# Altium schematic symbol library jlcpcb_2025_04_resistors_extended_0201.schlib: 1508 symbols (part 3 of 8)
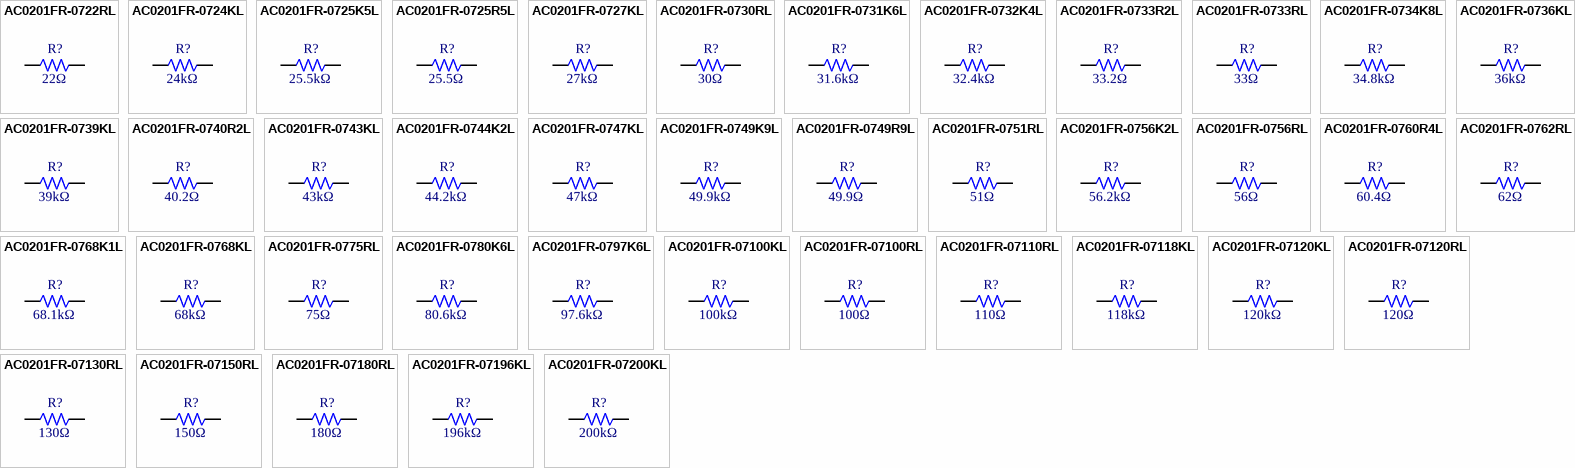
[diagram p39: symbols AC0201FR-0722RL to AC0201FR-07200KL]

## AC0201FR-07100KL
designator R?  Resistance: 100kΩ  (hidden comment: *)
Resistor, 100kΩ, ±1%, 50mW, 25V, ±200ppm/℃, -55℃~+155℃, SMD 0201; Manufacturer: Uniroyal; Manufacturer Part Number: AC0201FR-07100KL; Supplier 1: LCSC; Supplier Part Number 1: C226394; JLCPCB Part Number: C226394; Power Rating: 50mW; Category: Resistors; Package Size: 0201; JLCPCB Basic Part: Yes; Tolerance: ±1%; Voltage Rating: 25V; Temperature Coefficient: ±200ppm/℃; Temperature Rating: -55℃~+155℃; ComponentLink1Description: Datasheet; ComponentLink1URL: https://wmsc.lcsc.com/wmsc/upload/file/pdf/v2/lcsc/2008251104_YAGEO-AC0201FR-07100KL_C226394.pdf; ComponentLink2Description: JLCPCB Part URL; ComponentLink2URL: https://jlcpcb.com/partdetail/C226394
pins: 1, 2
1 alternate drawing of the same symbol

## AC0201FR-07100RL
designator R?  Resistance: 100Ω  (hidden comment: *)
Resistor, 100Ω, ±1%, 50mW, 25V, ±200ppm/℃, -55℃~+155℃, SMD 0201; Manufacturer: Uniroyal; Manufacturer Part Number: AC0201FR-07100RL; Supplier 1: LCSC; Supplier Part Number 1: C226395; JLCPCB Part Number: C226395; Power Rating: 50mW; Category: Resistors; Package Size: 0201; JLCPCB Basic Part: Yes; Tolerance: ±1%; Voltage Rating: 25V; Temperature Coefficient: ±200ppm/℃; Temperature Rating: -55℃~+155℃; ComponentLink1Description: Datasheet; ComponentLink1URL: https://wmsc.lcsc.com/wmsc/upload/file/pdf/v2/lcsc/2201242230_YAGEO-AC0201FR-07100RL_C226395.pdf; ComponentLink2Description: JLCPCB Part URL; ComponentLink2URL: https://jlcpcb.com/partdetail/C226395
pins: 1, 2
1 alternate drawing of the same symbol

## AC0201FR-07110RL
designator R?  Resistance: 110Ω  (hidden comment: *)
Resistor, 110Ω, ±1%, 50mW, ±200ppm/℃, -55℃~+155℃, SMD 0201; Manufacturer: Uniroyal; Manufacturer Part Number: AC0201FR-07110RL; Supplier 1: LCSC; Supplier Part Number 1: C910593; JLCPCB Part Number: C910593; Power Rating: 50mW; Category: Resistors; Package Size: 0201; JLCPCB Basic Part: Yes; Tolerance: ±1%; Temperature Coefficient: ±200ppm/℃; Temperature Rating: -55℃~+155℃; ComponentLink1Description: Datasheet; ComponentLink1URL: https://wmsc.lcsc.com/wmsc/upload/file/pdf/v2/lcsc/2201242100_YAGEO-AC0201FR-07110RL_C910593.pdf; ComponentLink2Description: JLCPCB Part URL; ComponentLink2URL: https://jlcpcb.com/partdetail/C910593
pins: 1, 2
1 alternate drawing of the same symbol

## AC0201FR-07118KL
designator R?  Resistance: 118kΩ  (hidden comment: *)
Resistor, 118kΩ, ±1%, 50mW, ±200ppm/℃, -55℃~+155℃, SMD 0201; Manufacturer: Uniroyal; Manufacturer Part Number: AC0201FR-07118KL; Supplier 1: LCSC; Supplier Part Number 1: C910594; JLCPCB Part Number: C910594; Power Rating: 50mW; Category: Resistors; Package Size: 0201; JLCPCB Basic Part: Yes; Tolerance: ±1%; Temperature Coefficient: ±200ppm/℃; Temperature Rating: -55℃~+155℃; ComponentLink1Description: Datasheet; ComponentLink1URL: https://wmsc.lcsc.com/wmsc/upload/file/pdf/v2/lcsc/2201242100_YAGEO-AC0201FR-07118KL_C910594.pdf; ComponentLink2Description: JLCPCB Part URL; ComponentLink2URL: https://jlcpcb.com/partdetail/C910594
pins: 1, 2
1 alternate drawing of the same symbol

## AC0201FR-07120KL
designator R?  Resistance: 120kΩ  (hidden comment: *)
Resistor, 120kΩ, ±1%, 50mW, 25V, ±200ppm/℃, -55℃~+155℃, SMD 0201; Manufacturer: Uniroyal; Manufacturer Part Number: AC0201FR-07120KL; Supplier 1: LCSC; Supplier Part Number 1: C144832; JLCPCB Part Number: C144832; Power Rating: 50mW; Category: Resistors; Package Size: 0201; JLCPCB Basic Part: Yes; Tolerance: ±1%; Voltage Rating: 25V; Temperature Coefficient: ±200ppm/℃; Temperature Rating: -55℃~+155℃; ComponentLink1Description: Datasheet; ComponentLink1URL: https://wmsc.lcsc.com/wmsc/upload/file/pdf/v2/lcsc/2304140030_YAGEO-AC0201FR-07120KL_C144832.pdf; ComponentLink2Description: JLCPCB Part URL; ComponentLink2URL: https://jlcpcb.com/partdetail/C144832
pins: 1, 2
1 alternate drawing of the same symbol

## AC0201FR-07120RL
designator R?  Resistance: 120Ω  (hidden comment: *)
Resistor, 120Ω, ±1%, 50mW, 25V, ±200ppm/℃, -55℃~+155℃, SMD 0201; Manufacturer: Uniroyal; Manufacturer Part Number: AC0201FR-07120RL; Supplier 1: LCSC; Supplier Part Number 1: C226406; JLCPCB Part Number: C226406; Power Rating: 50mW; Category: Resistors; Package Size: 0201; JLCPCB Basic Part: Yes; Tolerance: ±1%; Voltage Rating: 25V; Temperature Coefficient: ±200ppm/℃; Temperature Rating: -55℃~+155℃; ComponentLink1Description: Datasheet; ComponentLink1URL: https://wmsc.lcsc.com/wmsc/upload/file/pdf/v2/lcsc/2111171830_YAGEO-AC0201FR-07120RL_C226406.pdf; ComponentLink2Description: JLCPCB Part URL; ComponentLink2URL: https://jlcpcb.com/partdetail/C226406
pins: 1, 2
1 alternate drawing of the same symbol

## AC0201FR-07130RL
designator R?  Resistance: 130Ω  (hidden comment: *)
Resistor, 130Ω, ±1%, 50mW, 25V, ±200ppm/℃, -55℃~+155℃, SMD 0201; Manufacturer: Uniroyal; Manufacturer Part Number: AC0201FR-07130RL; Supplier 1: LCSC; Supplier Part Number 1: C910599; JLCPCB Part Number: C910599; Power Rating: 50mW; Category: Resistors; Package Size: 0201; JLCPCB Basic Part: Yes; Tolerance: ±1%; Voltage Rating: 25V; Temperature Coefficient: ±200ppm/℃; Temperature Rating: -55℃~+155℃; ComponentLink1Description: Datasheet; ComponentLink1URL: https://wmsc.lcsc.com/wmsc/upload/file/pdf/v2/lcsc/2201242100_YAGEO-AC0201FR-07130RL_C910599.pdf; ComponentLink2Description: JLCPCB Part URL; ComponentLink2URL: https://jlcpcb.com/partdetail/C910599
pins: 1, 2
1 alternate drawing of the same symbol

## AC0201FR-07150RL
designator R?  Resistance: 150Ω  (hidden comment: *)
Resistor, 150Ω, ±1%, 50mW, ±200ppm/℃, -55℃~+155℃, SMD 0201; Manufacturer: Uniroyal; Manufacturer Part Number: AC0201FR-07150RL; Supplier 1: LCSC; Supplier Part Number 1: C226421; JLCPCB Part Number: C226421; Power Rating: 50mW; Category: Resistors; Package Size: 0201; JLCPCB Basic Part: Yes; Tolerance: ±1%; Temperature Coefficient: ±200ppm/℃; Temperature Rating: -55℃~+155℃; ComponentLink1Description: Datasheet; ComponentLink1URL: https://wmsc.lcsc.com/wmsc/upload/file/pdf/v2/lcsc/2111101730_YAGEO-AC0201FR-07150RL_C226421.pdf; ComponentLink2Description: JLCPCB Part URL; ComponentLink2URL: https://jlcpcb.com/partdetail/C226421
pins: 1, 2
1 alternate drawing of the same symbol

## AC0201FR-07180RL
designator R?  Resistance: 180Ω  (hidden comment: *)
Resistor, 180Ω, ±1%, 50mW, ±200ppm/℃, -55℃~+155℃, SMD 0201; Manufacturer: Uniroyal; Manufacturer Part Number: AC0201FR-07180RL; Supplier 1: LCSC; Supplier Part Number 1: C226435; JLCPCB Part Number: C226435; Power Rating: 50mW; Category: Resistors; Package Size: 0201; JLCPCB Basic Part: Yes; Tolerance: ±1%; Temperature Coefficient: ±200ppm/℃; Temperature Rating: -55℃~+155℃; ComponentLink1Description: Datasheet; ComponentLink1URL: https://wmsc.lcsc.com/wmsc/upload/file/pdf/v2/lcsc/2112171030_YAGEO-AC0201FR-07180RL_C226435.pdf; ComponentLink2Description: JLCPCB Part URL; ComponentLink2URL: https://jlcpcb.com/partdetail/C226435
pins: 1, 2
1 alternate drawing of the same symbol

## AC0201FR-07196KL
designator R?  Resistance: 196kΩ  (hidden comment: *)
Resistor, 196kΩ, ±1%, 50mW, ±200ppm/℃, -55℃~+155℃, SMD 0201; Manufacturer: Uniroyal; Manufacturer Part Number: AC0201FR-07196KL; Supplier 1: LCSC; Supplier Part Number 1: C910609; JLCPCB Part Number: C910609; Power Rating: 50mW; Category: Resistors; Package Size: 0201; JLCPCB Basic Part: Yes; Tolerance: ±1%; Temperature Coefficient: ±200ppm/℃; Temperature Rating: -55℃~+155℃; ComponentLink1Description: Datasheet; ComponentLink1URL: https://wmsc.lcsc.com/wmsc/upload/file/pdf/v2/lcsc/2201242100_YAGEO-AC0201FR-07196KL_C910609.pdf; ComponentLink2Description: JLCPCB Part URL; ComponentLink2URL: https://jlcpcb.com/partdetail/C910609
pins: 1, 2
1 alternate drawing of the same symbol

## AC0201FR-07200KL
designator R?  Resistance: 200kΩ  (hidden comment: *)
Resistor, 200kΩ, ±1%, 50mW, 25V, ±200ppm/℃, -55℃~+155℃, SMD 0201; Manufacturer: Uniroyal; Manufacturer Part Number: AC0201FR-07200KL; Supplier 1: LCSC; Supplier Part Number 1: C226460; JLCPCB Part Number: C226460; Power Rating: 50mW; Category: Resistors; Package Size: 0201; JLCPCB Basic Part: Yes; Tolerance: ±1%; Voltage Rating: 25V; Temperature Coefficient: ±200ppm/℃; Temperature Rating: -55℃~+155℃; ComponentLink1Description: Datasheet; ComponentLink1URL: https://wmsc.lcsc.com/wmsc/upload/file/pdf/v2/lcsc/2112131730_YAGEO-AC0201FR-07200KL_C226460.pdf; ComponentLink2Description: JLCPCB Part URL; ComponentLink2URL: https://jlcpcb.com/partdetail/C226460
pins: 1, 2
1 alternate drawing of the same symbol

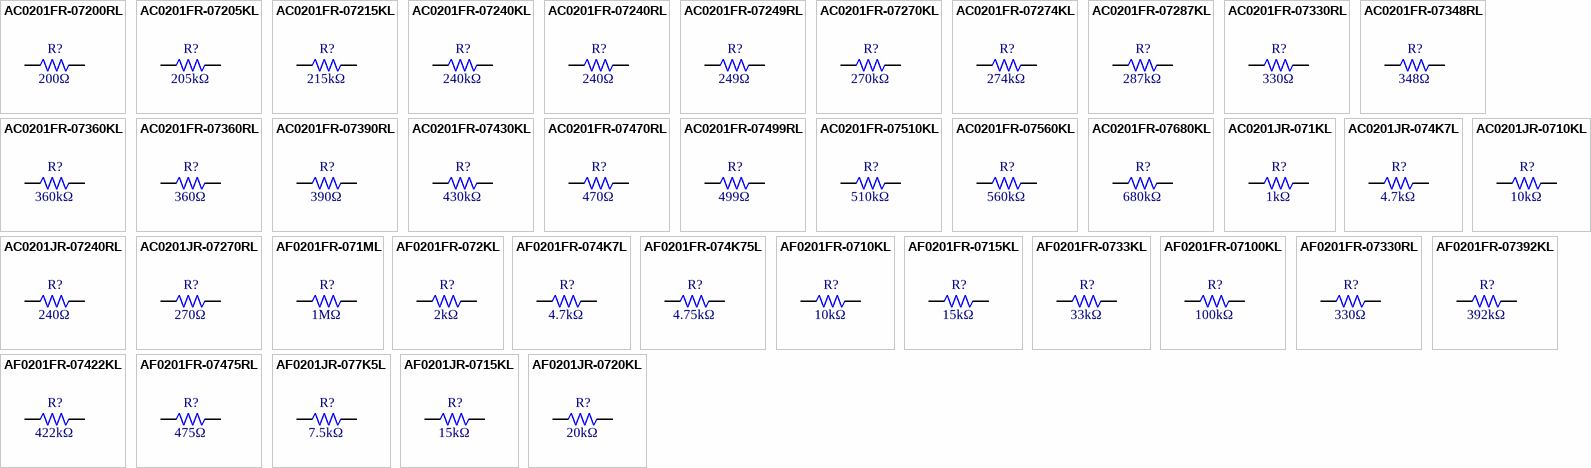
[diagram p10: symbols AC0201FR-07200RL to AF0201JR-0720KL]

## AC0201FR-07200RL
designator R?  Resistance: 200Ω  (hidden comment: *)
Resistor, 200Ω, ±1%, 50mW, ±200ppm/℃, -55℃~+155℃, SMD 0201; Manufacturer: Uniroyal; Manufacturer Part Number: AC0201FR-07200RL; Supplier 1: LCSC; Supplier Part Number 1: C226461; JLCPCB Part Number: C226461; Power Rating: 50mW; Category: Resistors; Package Size: 0201; JLCPCB Basic Part: Yes; Tolerance: ±1%; Temperature Coefficient: ±200ppm/℃; Temperature Rating: -55℃~+155℃; ComponentLink1Description: Datasheet; ComponentLink1URL: https://wmsc.lcsc.com/wmsc/upload/file/pdf/v2/lcsc/2209191401_YAGEO-AC0201FR-07200RL_C226461.pdf; ComponentLink2Description: JLCPCB Part URL; ComponentLink2URL: https://jlcpcb.com/partdetail/C226461
pins: 1, 2
1 alternate drawing of the same symbol

## AC0201FR-07205KL
designator R?  Resistance: 205kΩ  (hidden comment: *)
Resistor, 205kΩ, ±1%, 50mW, ±200ppm/℃, -55℃~+155℃, SMD 0201; Manufacturer: Uniroyal; Manufacturer Part Number: AC0201FR-07205KL; Supplier 1: LCSC; Supplier Part Number 1: C910616; JLCPCB Part Number: C910616; Power Rating: 50mW; Category: Resistors; Package Size: 0201; JLCPCB Basic Part: Yes; Tolerance: ±1%; Temperature Coefficient: ±200ppm/℃; Temperature Rating: -55℃~+155℃; ComponentLink1Description: Datasheet; ComponentLink1URL: https://wmsc.lcsc.com/wmsc/upload/file/pdf/v2/lcsc/2201242100_YAGEO-AC0201FR-07205KL_C910616.pdf; ComponentLink2Description: JLCPCB Part URL; ComponentLink2URL: https://jlcpcb.com/partdetail/C910616
pins: 1, 2
1 alternate drawing of the same symbol

## AC0201FR-07215KL
designator R?  Resistance: 215kΩ  (hidden comment: *)
Resistor, 215kΩ, ±1%, 50mW, ±200ppm/℃, -55℃~+155℃, SMD 0201; Manufacturer: Uniroyal; Manufacturer Part Number: AC0201FR-07215KL; Supplier 1: LCSC; Supplier Part Number 1: C910618; JLCPCB Part Number: C910618; Power Rating: 50mW; Category: Resistors; Package Size: 0201; JLCPCB Basic Part: Yes; Tolerance: ±1%; Temperature Coefficient: ±200ppm/℃; Temperature Rating: -55℃~+155℃; ComponentLink1Description: Datasheet; ComponentLink1URL: https://wmsc.lcsc.com/wmsc/upload/file/pdf/v2/lcsc/2201242100_YAGEO-AC0201FR-07215KL_C910618.pdf; ComponentLink2Description: JLCPCB Part URL; ComponentLink2URL: https://jlcpcb.com/partdetail/C910618
pins: 1, 2
1 alternate drawing of the same symbol

## AC0201FR-07240KL
designator R?  Resistance: 240kΩ  (hidden comment: *)
Resistor, 240kΩ, ±1%, 50mW, 25V, ±200ppm/℃, -55℃~+155℃, SMD 0201; Manufacturer: Uniroyal; Manufacturer Part Number: AC0201FR-07240KL; Supplier 1: LCSC; Supplier Part Number 1: C226475; JLCPCB Part Number: C226475; Power Rating: 50mW; Category: Resistors; Package Size: 0201; JLCPCB Basic Part: Yes; Tolerance: ±1%; Voltage Rating: 25V; Temperature Coefficient: ±200ppm/℃; Temperature Rating: -55℃~+155℃; ComponentLink1Description: Datasheet; ComponentLink1URL: https://wmsc.lcsc.com/wmsc/upload/file/pdf/v2/lcsc/2111171830_YAGEO-AC0201FR-07240KL_C226475.pdf; ComponentLink2Description: JLCPCB Part URL; ComponentLink2URL: https://jlcpcb.com/partdetail/C226475
pins: 1, 2
1 alternate drawing of the same symbol

## AC0201FR-07240RL
designator R?  Resistance: 240Ω  (hidden comment: *)
Resistor, 240Ω, ±1%, 50mW, 25V, ±200ppm/℃, -55℃~+155℃, SMD 0201; Manufacturer: Uniroyal; Manufacturer Part Number: AC0201FR-07240RL; Supplier 1: LCSC; Supplier Part Number 1: C226476; JLCPCB Part Number: C226476; Power Rating: 50mW; Category: Resistors; Package Size: 0201; JLCPCB Basic Part: Yes; Tolerance: ±1%; Voltage Rating: 25V; Temperature Coefficient: ±200ppm/℃; Temperature Rating: -55℃~+155℃; ComponentLink1Description: Datasheet; ComponentLink1URL: https://wmsc.lcsc.com/wmsc/upload/file/pdf/v2/lcsc/2201242230_YAGEO-AC0201FR-07240RL_C226476.pdf; ComponentLink2Description: JLCPCB Part URL; ComponentLink2URL: https://jlcpcb.com/partdetail/C226476
pins: 1, 2
1 alternate drawing of the same symbol

## AC0201FR-07249RL
designator R?  Resistance: 249Ω  (hidden comment: *)
Resistor, 249Ω, ±1%, 50mW, 25V, ±200ppm/℃, -55℃~+155℃, SMD 0201; Manufacturer: Uniroyal; Manufacturer Part Number: AC0201FR-07249RL; Supplier 1: LCSC; Supplier Part Number 1: C910622; JLCPCB Part Number: C910622; Power Rating: 50mW; Category: Resistors; Package Size: 0201; JLCPCB Basic Part: Yes; Tolerance: ±1%; Voltage Rating: 25V; Temperature Coefficient: ±200ppm/℃; Temperature Rating: -55℃~+155℃; ComponentLink1Description: Datasheet; ComponentLink1URL: https://wmsc.lcsc.com/wmsc/upload/file/pdf/v2/lcsc/2201242100_YAGEO-AC0201FR-07249RL_C910622.pdf; ComponentLink2Description: JLCPCB Part URL; ComponentLink2URL: https://jlcpcb.com/partdetail/C910622
pins: 1, 2
1 alternate drawing of the same symbol

## AC0201FR-07270KL
designator R?  Resistance: 270kΩ  (hidden comment: *)
Resistor, 270kΩ, ±1%, 50mW, 25V, ±200ppm/℃, -55℃~+155℃, SMD 0201; Manufacturer: Uniroyal; Manufacturer Part Number: AC0201FR-07270KL; Supplier 1: LCSC; Supplier Part Number 1: C910626; JLCPCB Part Number: C910626; Power Rating: 50mW; Category: Resistors; Package Size: 0201; JLCPCB Basic Part: Yes; Tolerance: ±1%; Voltage Rating: 25V; Temperature Coefficient: ±200ppm/℃; Temperature Rating: -55℃~+155℃; ComponentLink1Description: Datasheet; ComponentLink1URL: https://wmsc.lcsc.com/wmsc/upload/file/pdf/v2/lcsc/2201242100_YAGEO-AC0201FR-07270KL_C910626.pdf; ComponentLink2Description: JLCPCB Part URL; ComponentLink2URL: https://jlcpcb.com/partdetail/C910626
pins: 1, 2
1 alternate drawing of the same symbol

## AC0201FR-07274KL
designator R?  Resistance: 274kΩ  (hidden comment: *)
Resistor, 274kΩ, ±1%, 50mW, ±200ppm/℃, -55℃~+155℃, SMD 0201; Manufacturer: Uniroyal; Manufacturer Part Number: AC0201FR-07274KL; Supplier 1: LCSC; Supplier Part Number 1: C910627; JLCPCB Part Number: C910627; Power Rating: 50mW; Category: Resistors; Package Size: 0201; JLCPCB Basic Part: Yes; Tolerance: ±1%; Temperature Coefficient: ±200ppm/℃; Temperature Rating: -55℃~+155℃; ComponentLink1Description: Datasheet; ComponentLink1URL: https://wmsc.lcsc.com/wmsc/upload/file/pdf/v2/lcsc/2201242100_YAGEO-AC0201FR-07274KL_C910627.pdf; ComponentLink2Description: JLCPCB Part URL; ComponentLink2URL: https://jlcpcb.com/partdetail/C910627
pins: 1, 2
1 alternate drawing of the same symbol

## AC0201FR-07287KL
designator R?  Resistance: 287kΩ  (hidden comment: *)
Resistor, 287kΩ, ±1%, 50mW, ±200ppm/℃, -55℃~+155℃, SMD 0201; Manufacturer: Uniroyal; Manufacturer Part Number: AC0201FR-07287KL; Supplier 1: LCSC; Supplier Part Number 1: C910629; JLCPCB Part Number: C910629; Power Rating: 50mW; Category: Resistors; Package Size: 0201; JLCPCB Basic Part: Yes; Tolerance: ±1%; Temperature Coefficient: ±200ppm/℃; Temperature Rating: -55℃~+155℃; ComponentLink1Description: Datasheet; ComponentLink1URL: https://wmsc.lcsc.com/wmsc/upload/file/pdf/v2/lcsc/2201242100_YAGEO-AC0201FR-07287KL_C910629.pdf; ComponentLink2Description: JLCPCB Part URL; ComponentLink2URL: https://jlcpcb.com/partdetail/C910629
pins: 1, 2
1 alternate drawing of the same symbol

## AC0201FR-07330RL
designator R?  Resistance: 330Ω  (hidden comment: *)
Resistor, 330Ω, ±1%, 100mW, 25V, ±200ppm/℃, -55℃~+155℃, SMD 0201; Manufacturer: Uniroyal; Manufacturer Part Number: AC0201FR-07330RL; Supplier 1: LCSC; Supplier Part Number 1: C226508; JLCPCB Part Number: C226508; Power Rating: 100mW; Category: Resistors; Package Size: 0201; JLCPCB Basic Part: Yes; Tolerance: ±1%; Voltage Rating: 25V; Temperature Coefficient: ±200ppm/℃; Temperature Rating: -55℃~+155℃; ComponentLink1Description: Datasheet; ComponentLink1URL: https://wmsc.lcsc.com/wmsc/upload/file/pdf/v2/lcsc/2110112130_YAGEO-AC0201FR-07330RL_C226508.pdf; ComponentLink2Description: JLCPCB Part URL; ComponentLink2URL: https://jlcpcb.com/partdetail/C226508
pins: 1, 2
1 alternate drawing of the same symbol

## AC0201FR-07348RL
designator R?  Resistance: 348Ω  (hidden comment: *)
Resistor, 348Ω, ±1%, 50mW, ±200ppm/℃, -55℃~+155℃, SMD 0201; Manufacturer: Uniroyal; Manufacturer Part Number: AC0201FR-07348RL; Supplier 1: LCSC; Supplier Part Number 1: C910635; JLCPCB Part Number: C910635; Power Rating: 50mW; Category: Resistors; Package Size: 0201; JLCPCB Basic Part: Yes; Tolerance: ±1%; Temperature Coefficient: ±200ppm/℃; Temperature Rating: -55℃~+155℃; ComponentLink1Description: Datasheet; ComponentLink1URL: https://wmsc.lcsc.com/wmsc/upload/file/pdf/v2/lcsc/2201242100_YAGEO-AC0201FR-07348RL_C910635.pdf; ComponentLink2Description: JLCPCB Part URL; ComponentLink2URL: https://jlcpcb.com/partdetail/C910635
pins: 1, 2
1 alternate drawing of the same symbol

## AC0201FR-07360KL
designator R?  Resistance: 360kΩ  (hidden comment: *)
Resistor, 360kΩ, ±1%, 50mW, 25V, ±200ppm/℃, -55℃~+155℃, SMD 0201; Manufacturer: Uniroyal; Manufacturer Part Number: AC0201FR-07360KL; Supplier 1: LCSC; Supplier Part Number 1: C226519; JLCPCB Part Number: C226519; Power Rating: 50mW; Category: Resistors; Package Size: 0201; JLCPCB Basic Part: Yes; Tolerance: ±1%; Voltage Rating: 25V; Temperature Coefficient: ±200ppm/℃; Temperature Rating: -55℃~+155℃; ComponentLink1Description: Datasheet; ComponentLink1URL: https://wmsc.lcsc.com/wmsc/upload/file/pdf/v2/lcsc/2201242230_YAGEO-AC0201FR-07360KL_C226519.pdf; ComponentLink2Description: JLCPCB Part URL; ComponentLink2URL: https://jlcpcb.com/partdetail/C226519
pins: 1, 2
1 alternate drawing of the same symbol

## AC0201FR-07360RL
designator R?  Resistance: 360Ω  (hidden comment: *)
Resistor, 360Ω, ±1%, 50mW, ±200ppm/℃, -55℃~+155℃, SMD 0201; Manufacturer: Uniroyal; Manufacturer Part Number: AC0201FR-07360RL; Supplier 1: LCSC; Supplier Part Number 1: C226520; JLCPCB Part Number: C226520; Power Rating: 50mW; Category: Resistors; Package Size: 0201; JLCPCB Basic Part: Yes; Tolerance: ±1%; Temperature Coefficient: ±200ppm/℃; Temperature Rating: -55℃~+155℃; ComponentLink1Description: Datasheet; ComponentLink1URL: https://wmsc.lcsc.com/wmsc/upload/file/pdf/v2/lcsc/2111101730_YAGEO-AC0201FR-07360RL_C226520.pdf; ComponentLink2Description: JLCPCB Part URL; ComponentLink2URL: https://jlcpcb.com/partdetail/C226520
pins: 1, 2
1 alternate drawing of the same symbol

## AC0201FR-07390RL
designator R?  Resistance: 390Ω  (hidden comment: *)
Resistor, 390Ω, ±1%, 50mW, 25V, ±200ppm/℃, -55℃~+155℃, SMD 0201; Manufacturer: Uniroyal; Manufacturer Part Number: AC0201FR-07390RL; Supplier 1: LCSC; Supplier Part Number 1: C226528; JLCPCB Part Number: C226528; Power Rating: 50mW; Category: Resistors; Package Size: 0201; JLCPCB Basic Part: Yes; Tolerance: ±1%; Voltage Rating: 25V; Temperature Coefficient: ±200ppm/℃; Temperature Rating: -55℃~+155℃; ComponentLink1Description: Datasheet; ComponentLink1URL: https://wmsc.lcsc.com/wmsc/upload/file/pdf/v2/lcsc/2201242230_YAGEO-AC0201FR-07390RL_C226528.pdf; ComponentLink2Description: JLCPCB Part URL; ComponentLink2URL: https://jlcpcb.com/partdetail/C226528
pins: 1, 2
1 alternate drawing of the same symbol

## AC0201FR-07430KL
designator R?  Resistance: 430kΩ  (hidden comment: *)
Resistor, 430kΩ, ±1%, 50mW, ±200ppm/℃, -55℃~+155℃, SMD 0201; Manufacturer: Uniroyal; Manufacturer Part Number: AC0201FR-07430KL; Supplier 1: LCSC; Supplier Part Number 1: C226547; JLCPCB Part Number: C226547; Power Rating: 50mW; Category: Resistors; Package Size: 0201; JLCPCB Basic Part: Yes; Tolerance: ±1%; Temperature Coefficient: ±200ppm/℃; Temperature Rating: -55℃~+155℃; ComponentLink1Description: Datasheet; ComponentLink1URL: https://wmsc.lcsc.com/wmsc/upload/file/pdf/v2/lcsc/2112171030_YAGEO-AC0201FR-07430KL_C226547.pdf; ComponentLink2Description: JLCPCB Part URL; ComponentLink2URL: https://jlcpcb.com/partdetail/C226547
pins: 1, 2
1 alternate drawing of the same symbol

## AC0201FR-07470RL
designator R?  Resistance: 470Ω  (hidden comment: *)
Resistor, 470Ω, ±1%, 50mW, ±200ppm/℃, -55℃~+155℃, SMD 0201; Manufacturer: Uniroyal; Manufacturer Part Number: AC0201FR-07470RL; Supplier 1: LCSC; Supplier Part Number 1: C226558; JLCPCB Part Number: C226558; Power Rating: 50mW; Category: Resistors; Package Size: 0201; JLCPCB Basic Part: Yes; Tolerance: ±1%; Temperature Coefficient: ±200ppm/℃; Temperature Rating: -55℃~+155℃; ComponentLink1Description: Datasheet; ComponentLink1URL: https://wmsc.lcsc.com/wmsc/upload/file/pdf/v2/lcsc/2111101730_YAGEO-AC0201FR-07470RL_C226558.pdf; ComponentLink2Description: JLCPCB Part URL; ComponentLink2URL: https://jlcpcb.com/partdetail/C226558
pins: 1, 2
1 alternate drawing of the same symbol

## AC0201FR-07499RL
designator R?  Resistance: 499Ω  (hidden comment: *)
Resistor, 499Ω, ±1%, 50mW, 25V, ±200ppm/℃, -55℃~+155℃, SMD 0201; Manufacturer: Uniroyal; Manufacturer Part Number: AC0201FR-07499RL; Supplier 1: LCSC; Supplier Part Number 1: C226563; JLCPCB Part Number: C226563; Power Rating: 50mW; Category: Resistors; Package Size: 0201; JLCPCB Basic Part: Yes; Tolerance: ±1%; Voltage Rating: 25V; Temperature Coefficient: ±200ppm/℃; Temperature Rating: -55℃~+155℃; ComponentLink1Description: Datasheet; ComponentLink1URL: https://wmsc.lcsc.com/wmsc/upload/file/pdf/v2/lcsc/2111021130_YAGEO-AC0201FR-07499RL_C226563.pdf; ComponentLink2Description: JLCPCB Part URL; ComponentLink2URL: https://jlcpcb.com/partdetail/C226563
pins: 1, 2
1 alternate drawing of the same symbol

## AC0201FR-07510KL
designator R?  Resistance: 510kΩ  (hidden comment: *)
Resistor, 510kΩ, ±1%, 50mW, 25V, ±200ppm/℃, -55℃~+155℃, SMD 0201; Manufacturer: Uniroyal; Manufacturer Part Number: AC0201FR-07510KL; Supplier 1: LCSC; Supplier Part Number 1: C226573; JLCPCB Part Number: C226573; Power Rating: 50mW; Category: Resistors; Package Size: 0201; JLCPCB Basic Part: Yes; Tolerance: ±1%; Voltage Rating: 25V; Temperature Coefficient: ±200ppm/℃; Temperature Rating: -55℃~+155℃; ComponentLink1Description: Datasheet; ComponentLink1URL: https://wmsc.lcsc.com/wmsc/upload/file/pdf/v2/lcsc/2111171830_YAGEO-AC0201FR-07510KL_C226573.pdf; ComponentLink2Description: JLCPCB Part URL; ComponentLink2URL: https://jlcpcb.com/partdetail/C226573
pins: 1, 2
1 alternate drawing of the same symbol

## AC0201FR-07560KL
designator R?  Resistance: 560kΩ  (hidden comment: *)
Resistor, 560kΩ, ±1%, 50mW, 25V, ±200ppm/℃, -55℃~+155℃, SMD 0201; Manufacturer: Uniroyal; Manufacturer Part Number: AC0201FR-07560KL; Supplier 1: LCSC; Supplier Part Number 1: C226579; JLCPCB Part Number: C226579; Power Rating: 50mW; Category: Resistors; Package Size: 0201; JLCPCB Basic Part: Yes; Tolerance: ±1%; Voltage Rating: 25V; Temperature Coefficient: ±200ppm/℃; Temperature Rating: -55℃~+155℃; ComponentLink1Description: Datasheet; ComponentLink1URL: https://wmsc.lcsc.com/wmsc/upload/file/pdf/v2/lcsc/2111171830_YAGEO-AC0201FR-07560KL_C226579.pdf; ComponentLink2Description: JLCPCB Part URL; ComponentLink2URL: https://jlcpcb.com/partdetail/C226579
pins: 1, 2
1 alternate drawing of the same symbol

## AC0201FR-07680KL
designator R?  Resistance: 680kΩ  (hidden comment: *)
Resistor, 680kΩ, ±1%, 50mW, ±200ppm/℃, -55℃~+155℃, SMD 0201; Manufacturer: Uniroyal; Manufacturer Part Number: AC0201FR-07680KL; Supplier 1: LCSC; Supplier Part Number 1: C226598; JLCPCB Part Number: C226598; Power Rating: 50mW; Category: Resistors; Package Size: 0201; JLCPCB Basic Part: Yes; Tolerance: ±1%; Temperature Coefficient: ±200ppm/℃; Temperature Rating: -55℃~+155℃; ComponentLink1Description: Datasheet; ComponentLink1URL: https://wmsc.lcsc.com/wmsc/upload/file/pdf/v2/lcsc/2111101730_YAGEO-AC0201FR-07680KL_C226598.pdf; ComponentLink2Description: JLCPCB Part URL; ComponentLink2URL: https://jlcpcb.com/partdetail/C226598
pins: 1, 2
1 alternate drawing of the same symbol

## AC0201JR-071KL
designator R?  Resistance: 1kΩ  (hidden comment: *)
Resistor, 1kΩ, ±5%, 50mW, 25V, ±200ppm/℃, -55℃~+155℃, SMD 0201; Manufacturer: Uniroyal; Manufacturer Part Number: AC0201JR-071KL; Supplier 1: LCSC; Supplier Part Number 1: C138297; JLCPCB Part Number: C138297; Power Rating: 50mW; Category: Resistors; Package Size: 0201; JLCPCB Basic Part: Yes; Tolerance: ±5%; Voltage Rating: 25V; Temperature Coefficient: ±200ppm/℃; Temperature Rating: -55℃~+155℃; ComponentLink1Description: Datasheet; ComponentLink1URL: https://wmsc.lcsc.com/wmsc/upload/file/pdf/v2/lcsc/2304140030_YAGEO-AC0201JR-071KL_C138297.pdf; ComponentLink2Description: JLCPCB Part URL; ComponentLink2URL: https://jlcpcb.com/partdetail/C138297
pins: 1, 2
1 alternate drawing of the same symbol

## AC0201JR-074K7L
designator R?  Resistance: 4.7kΩ  (hidden comment: *)
Resistor, 4.7kΩ, ±5%, 50mW, 25V, ±200ppm/℃, -55℃~+155℃, SMD 0201; Manufacturer: Uniroyal; Manufacturer Part Number: AC0201JR-074K7L; Supplier 1: LCSC; Supplier Part Number 1: C226669; JLCPCB Part Number: C226669; Power Rating: 50mW; Category: Resistors; Package Size: 0201; JLCPCB Basic Part: Yes; Tolerance: ±5%; Voltage Rating: 25V; Temperature Coefficient: ±200ppm/℃; Temperature Rating: -55℃~+155℃; ComponentLink1Description: Datasheet; ComponentLink1URL: https://wmsc.lcsc.com/wmsc/upload/file/pdf/v2/lcsc/1912111437_YAGEO-AC0201JR-074K7L_C226669.pdf; ComponentLink2Description: JLCPCB Part URL; ComponentLink2URL: https://jlcpcb.com/partdetail/C226669
pins: 1, 2
1 alternate drawing of the same symbol

## AC0201JR-0710KL
designator R?  Resistance: 10kΩ  (hidden comment: *)
Resistor, 10kΩ, ±5%, 50mW, 25V, ±200ppm/℃, -55℃~+155℃, SMD 0201; Manufacturer: Uniroyal; Manufacturer Part Number: AC0201JR-0710KL; Supplier 1: LCSC; Supplier Part Number 1: C144827; JLCPCB Part Number: C144827; Power Rating: 50mW; Category: Resistors; Package Size: 0201; JLCPCB Basic Part: Yes; Tolerance: ±5%; Voltage Rating: 25V; Temperature Coefficient: ±200ppm/℃; Temperature Rating: -55℃~+155℃; ComponentLink1Description: Datasheet; ComponentLink1URL: https://wmsc.lcsc.com/wmsc/upload/file/pdf/v2/lcsc/2304140030_YAGEO-AC0201JR-0710KL_C144827.pdf; ComponentLink2Description: JLCPCB Part URL; ComponentLink2URL: https://jlcpcb.com/partdetail/C144827
pins: 1, 2
1 alternate drawing of the same symbol

## AC0201JR-07240RL
designator R?  Resistance: 240Ω  (hidden comment: *)
Resistor, 240Ω, ±5%, 50mW, 25V, ±200ppm/℃, -55℃~+155℃, SMD 0201; Manufacturer: Uniroyal; Manufacturer Part Number: AC0201JR-07240RL; Supplier 1: LCSC; Supplier Part Number 1: C850705; JLCPCB Part Number: C850705; Power Rating: 50mW; Category: Resistors; Package Size: 0201; JLCPCB Basic Part: Yes; Tolerance: ±5%; Voltage Rating: 25V; Temperature Coefficient: ±200ppm/℃; Temperature Rating: -55℃~+155℃; ComponentLink1Description: Datasheet; ComponentLink1URL: https://wmsc.lcsc.com/wmsc/upload/file/pdf/v2/lcsc/2201242130_YAGEO-AC0201JR-07240RL_C850705.pdf; ComponentLink2Description: JLCPCB Part URL; ComponentLink2URL: https://jlcpcb.com/partdetail/C850705
pins: 1, 2
1 alternate drawing of the same symbol

## AC0201JR-07270RL
designator R?  Resistance: 270Ω  (hidden comment: *)
Resistor, 270Ω, ±5%, 50mW, 25V, ±200ppm/℃, -55℃~+155℃, SMD 0201; Manufacturer: Uniroyal; Manufacturer Part Number: AC0201JR-07270RL; Supplier 1: LCSC; Supplier Part Number 1: C144821; JLCPCB Part Number: C144821; Power Rating: 50mW; Category: Resistors; Package Size: 0201; JLCPCB Basic Part: Yes; Tolerance: ±5%; Voltage Rating: 25V; Temperature Coefficient: ±200ppm/℃; Temperature Rating: -55℃~+155℃; ComponentLink1Description: Datasheet; ComponentLink1URL: https://wmsc.lcsc.com/wmsc/upload/file/pdf/v2/lcsc/2304140030_YAGEO-AC0201JR-07270RL_C144821.pdf; ComponentLink2Description: JLCPCB Part URL; ComponentLink2URL: https://jlcpcb.com/partdetail/C144821
pins: 1, 2
1 alternate drawing of the same symbol

## AF0201FR-071ML
designator R?  Resistance: 1MΩ  (hidden comment: *)
Resistor, 1MΩ, ±1%, 50mW, 25V, ±200ppm/℃, -55℃~+125℃, SMD 0201; Manufacturer: Uniroyal; Manufacturer Part Number: AF0201FR-071ML; Supplier 1: LCSC; Supplier Part Number 1: C2105628; JLCPCB Part Number: C2105628; Power Rating: 50mW; Category: Resistors; Package Size: 0201; JLCPCB Basic Part: Yes; Tolerance: ±1%; Voltage Rating: 25V; Temperature Coefficient: ±200ppm/℃; Temperature Rating: -55℃~+125℃; ComponentLink1Description: Datasheet; ComponentLink1URL: https://wmsc.lcsc.com/wmsc/upload/file/pdf/v2/lcsc/2202021130_YAGEO-AF0201FR-071ML_C2105628.pdf; ComponentLink2Description: JLCPCB Part URL; ComponentLink2URL: https://jlcpcb.com/partdetail/C2105628
pins: 1, 2
1 alternate drawing of the same symbol

## AF0201FR-072KL
designator R?  Resistance: 2kΩ  (hidden comment: *)
Resistor, 2kΩ, ±1%, 50mW, 25V, ±200ppm/℃, -55℃~+125℃, SMD 0201; Manufacturer: Uniroyal; Manufacturer Part Number: AF0201FR-072KL; Supplier 1: LCSC; Supplier Part Number 1: C143987; JLCPCB Part Number: C143987; Power Rating: 50mW; Category: Resistors; Package Size: 0201; JLCPCB Basic Part: Yes; Tolerance: ±1%; Voltage Rating: 25V; Temperature Coefficient: ±200ppm/℃; Temperature Rating: -55℃~+125℃; ComponentLink1Description: Datasheet; ComponentLink1URL: https://wmsc.lcsc.com/wmsc/upload/file/pdf/v2/lcsc/2304140030_YAGEO-AF0201FR-072KL_C143987.pdf; ComponentLink2Description: JLCPCB Part URL; ComponentLink2URL: https://jlcpcb.com/partdetail/C143987
pins: 1, 2
1 alternate drawing of the same symbol

## AF0201FR-074K7L
designator R?  Resistance: 4.7kΩ  (hidden comment: *)
Resistor, 4.7kΩ, ±1%, 50mW, 25V, ±200ppm/℃, -55℃~+125℃, SMD 0201; Manufacturer: Uniroyal; Manufacturer Part Number: AF0201FR-074K7L; Supplier 1: LCSC; Supplier Part Number 1: C2105831; JLCPCB Part Number: C2105831; Power Rating: 50mW; Category: Resistors; Package Size: 0201; JLCPCB Basic Part: Yes; Tolerance: ±1%; Voltage Rating: 25V; Temperature Coefficient: ±200ppm/℃; Temperature Rating: -55℃~+125℃; ComponentLink1Description: Datasheet; ComponentLink1URL: https://wmsc.lcsc.com/wmsc/upload/file/pdf/v2/lcsc/2202021200_YAGEO-AF0201FR-074K7L_C2105831.pdf; ComponentLink2Description: JLCPCB Part URL; ComponentLink2URL: https://jlcpcb.com/partdetail/C2105831
pins: 1, 2
1 alternate drawing of the same symbol

## AF0201FR-074K75L
designator R?  Resistance: 4.75kΩ  (hidden comment: *)
Resistor, 4.75kΩ, ±1%, 50mW, 25V, ±200ppm/℃, -55℃~+125℃, SMD 0201; Manufacturer: Uniroyal; Manufacturer Part Number: AF0201FR-074K75L; Supplier 1: LCSC; Supplier Part Number 1: C705018; JLCPCB Part Number: C705018; Power Rating: 50mW; Category: Resistors; Package Size: 0201; JLCPCB Basic Part: Yes; Tolerance: ±1%; Voltage Rating: 25V; Temperature Coefficient: ±200ppm/℃; Temperature Rating: -55℃~+125℃; ComponentLink1Description: Datasheet; ComponentLink1URL: https://wmsc.lcsc.com/wmsc/upload/file/pdf/v2/lcsc/2007202020_YAGEO-AF0201FR-074K75L_C705018.pdf; ComponentLink2Description: JLCPCB Part URL; ComponentLink2URL: https://jlcpcb.com/partdetail/C705018
pins: 1, 2
1 alternate drawing of the same symbol

## AF0201FR-0710KL
designator R?  Resistance: 10kΩ  (hidden comment: *)
Resistor, 10kΩ, ±1%, 50mW, 25V, ±200ppm/℃, -55℃~+125℃, SMD 0201; Manufacturer: Uniroyal; Manufacturer Part Number: AF0201FR-0710KL; Supplier 1: LCSC; Supplier Part Number 1: C143978; JLCPCB Part Number: C143978; Power Rating: 50mW; Category: Resistors; Package Size: 0201; JLCPCB Basic Part: Yes; Tolerance: ±1%; Voltage Rating: 25V; Temperature Coefficient: ±200ppm/℃; Temperature Rating: -55℃~+125℃; ComponentLink1Description: Datasheet; ComponentLink1URL: https://wmsc.lcsc.com/wmsc/upload/file/pdf/v2/lcsc/2304140030_YAGEO-AF0201FR-0710KL_C143978.pdf; ComponentLink2Description: JLCPCB Part URL; ComponentLink2URL: https://jlcpcb.com/partdetail/C143978
pins: 1, 2
1 alternate drawing of the same symbol

## AF0201FR-0715KL
designator R?  Resistance: 15kΩ  (hidden comment: *)
Resistor, 15kΩ, ±1%, 50mW, 25V, ±200ppm/℃, -55℃~+125℃, SMD 0201; Manufacturer: Uniroyal; Manufacturer Part Number: AF0201FR-0715KL; Supplier 1: LCSC; Supplier Part Number 1: C143982; JLCPCB Part Number: C143982; Power Rating: 50mW; Category: Resistors; Package Size: 0201; JLCPCB Basic Part: Yes; Tolerance: ±1%; Voltage Rating: 25V; Temperature Coefficient: ±200ppm/℃; Temperature Rating: -55℃~+125℃; ComponentLink1Description: Datasheet; ComponentLink1URL: https://wmsc.lcsc.com/wmsc/upload/file/pdf/v2/lcsc/2304140030_YAGEO-AF0201FR-0715KL_C143982.pdf; ComponentLink2Description: JLCPCB Part URL; ComponentLink2URL: https://jlcpcb.com/partdetail/C143982
pins: 1, 2
1 alternate drawing of the same symbol

## AF0201FR-0733KL
designator R?  Resistance: 33kΩ  (hidden comment: *)
Resistor, 33kΩ, ±1%, 50mW, 25V, ±200ppm/℃, -55℃~+125℃, SMD 0201; Manufacturer: Uniroyal; Manufacturer Part Number: AF0201FR-0733KL; Supplier 1: LCSC; Supplier Part Number 1: C2105696; JLCPCB Part Number: C2105696; Power Rating: 50mW; Category: Resistors; Package Size: 0201; JLCPCB Basic Part: Yes; Tolerance: ±1%; Voltage Rating: 25V; Temperature Coefficient: ±200ppm/℃; Temperature Rating: -55℃~+125℃; ComponentLink1Description: Datasheet; ComponentLink1URL: https://wmsc.lcsc.com/wmsc/upload/file/pdf/v2/lcsc/2202021130_YAGEO-AF0201FR-0733KL_C2105696.pdf; ComponentLink2Description: JLCPCB Part URL; ComponentLink2URL: https://jlcpcb.com/partdetail/C2105696
pins: 1, 2
1 alternate drawing of the same symbol

## AF0201FR-07100KL
designator R?  Resistance: 100kΩ  (hidden comment: *)
Resistor, 100kΩ, ±1%, 50mW, 25V, ±200ppm/℃, -55℃~+125℃, SMD 0201; Manufacturer: Uniroyal; Manufacturer Part Number: AF0201FR-07100KL; Supplier 1: LCSC; Supplier Part Number 1: C143976; JLCPCB Part Number: C143976; Power Rating: 50mW; Category: Resistors; Package Size: 0201; JLCPCB Basic Part: Yes; Tolerance: ±1%; Voltage Rating: 25V; Temperature Coefficient: ±200ppm/℃; Temperature Rating: -55℃~+125℃; ComponentLink1Description: Datasheet; ComponentLink1URL: https://wmsc.lcsc.com/wmsc/upload/file/pdf/v2/lcsc/2304140030_YAGEO-AF0201FR-07100KL_C143976.pdf; ComponentLink2Description: JLCPCB Part URL; ComponentLink2URL: https://jlcpcb.com/partdetail/C143976
pins: 1, 2
1 alternate drawing of the same symbol

## AF0201FR-07330RL
designator R?  Resistance: 330Ω  (hidden comment: *)
Resistor, 330Ω, ±1%, 50mW, 25V, ±200ppm/℃, -55℃~+125℃, SMD 0201; Manufacturer: Uniroyal; Manufacturer Part Number: AF0201FR-07330RL; Supplier 1: LCSC; Supplier Part Number 1: C914777; JLCPCB Part Number: C914777; Power Rating: 50mW; Category: Resistors; Package Size: 0201; JLCPCB Basic Part: Yes; Tolerance: ±1%; Voltage Rating: 25V; Temperature Coefficient: ±200ppm/℃; Temperature Rating: -55℃~+125℃; ComponentLink1Description: Datasheet; ComponentLink1URL: https://wmsc.lcsc.com/wmsc/upload/file/pdf/v2/lcsc/2011202106_YAGEO-AF0201FR-07330RL_C914777.pdf; ComponentLink2Description: JLCPCB Part URL; ComponentLink2URL: https://jlcpcb.com/partdetail/C914777
pins: 1, 2
1 alternate drawing of the same symbol
